# Altium integrated library OneBox.IntLib: 172 symbols (part 1 of 2)
Pins are listed as number, name and electrical type; pins without a type are passive.

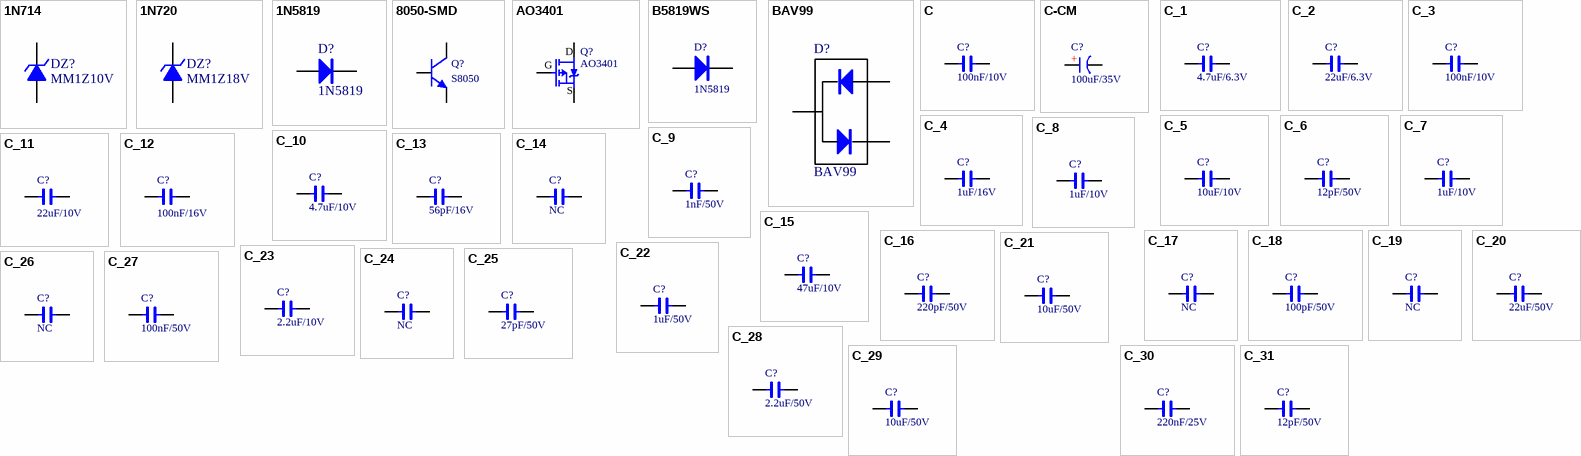
[diagram p0: symbols 1N714 to C_31]

## 1N714
designator DZ?, comment MM1Z10V
10V/0.25W稳压管; BOM名称: 10V/0.5W稳压管; 版权归属: 源创客; 学习资源: www.ooocke.com
footprint SOD-123 (2.7x1.6X1.1mm（长宽高，不包括引脚）)
pins: 1 A, 2 K

## 1N720
designator DZ?, comment MM1Z18V
18V/0.25W稳压管; BOM名称: 10V/0.5W稳压管; 版权归属: 源创客; 学习资源: www.ooocke.com
footprint SOD-123 (2.7x1.6X1.1mm（长宽高，不包括引脚）)
pins: 1 A, 2 K

## 1N5819
designator D?
肖特基二极管; 版权归属: 源创客; 属性: 40V/2A; BOM名称: 肖特基二极管; 学习资源: www.ooocke.com
footprint SOD-323 (1.8x1.3X0.9mm（长宽高，不包括引脚）)
footprint SMA (4.5x2.6*2.2mm（长宽高，不包括引脚）)
pins: 1 A, 2 K

## 8050-SMD
designator Q?, comment S8050
高频放大-NPN型; 版权归属: 源创客; 属性: 40V 1.5A 1W 100MHZ; BOM名称: 高频放大-NPN型; 学习资源: www.ooocke.com
footprint SOT23-3L (3x1.3x1mm(长宽高))
pins: 1 B, 2 E, 3 C

## AO3401
designator Q?
P沟道; BOM名称: 场效应管; 版权归属: 源创客; 描述: P沟道 30V/4.2A; 学习资源: www.ooocke.com
footprint SOT23-3L (3x1.3x1mm(长宽高))
pins: 1 G, 2 S, 3 D

## B5819WS
designator D?, comment 1N5819
肖特基二极管; 版权归属: 源创客; 属性: 40V/2A; BOM名称: 肖特基二极管; 学习资源: www.ooocke.com
footprint SOD-323 (1.8x1.3X0.9mm（长宽高，不包括引脚）)
pins: 1 A, 2 K

## BAV99
designator D?
双开关二极管; BOM名称: 肖特基二极管; 版权归属: 源创客; 属性: 40V/2A; 学习资源: www.ooocke.com
footprint SOT23-3L (3x1.3x1mm(长宽高))
pins: 1 K, 2 K, 3 K

## C
designator C?, comment 100nF/10V
X5R 10V C0402; BOM名称: 无极性贴片电容; ComponentLink1Description: Datasheet; ComponentLink1URL: www.baidu.com
footprint C0201_M (贴片MLCC电容)
footprint C0201_NS (贴片MLCC电容-无丝印)
footprint C0402_M (贴片MLCC电容)
footprint C0402_NS (贴片MLCC电容-无丝印)
footprint C0603_M (贴片MLCC电容-无丝印)
footprint C0603_NS (贴片MLCC电容-无丝印)
footprint C0805_M (贴片MLCC电容)
footprint C0805_NS (贴片MLCC电容-无丝印)
footprint C01005_NS (贴片MLCC电容-无丝印)
footprint C1206_M (贴片MLCC电容)
footprint C1210_NS (贴片MLCC电容 -无丝印)
footprint C1206_NS (贴片MLCC电容-无丝印)
footprint C1210_M (贴片MLCC电容)
footprint C1808_M (贴片MLCC电容)
footprint C1825_M (贴片MLCC电容)
footprint C2225_M (贴片MLCC电容)
pins: 1, 2

## C-CM
designator C?, comment 100uF/35V
CAP6.3x7.7; BOM名称: 贴片电解电容; 版权归属: 源创客; 学习资源: www.ooocke.com
footprint CM D(6.3*7.7) (贴片电解电容，直径6.3mm，高7.7mm)
pins: 1 A, 2 K
text: +

## C_1
designator C?, comment 4.7uF/6.3V
X5R 6.3V C0402; BOM名称: 无极性贴片电容; ComponentLink1Description: Datasheet; ComponentLink1URL: www.baidu.com
footprint C0201_M (贴片MLCC电容)
footprint C0201_NS (贴片MLCC电容-无丝印)
footprint C0402_M (贴片MLCC电容)
footprint C0402_NS (贴片MLCC电容-无丝印)
footprint C0603_M (贴片MLCC电容-无丝印)
footprint C0603_NS (贴片MLCC电容-无丝印)
footprint C0805_M (贴片MLCC电容)
footprint C0805_NS (贴片MLCC电容-无丝印)
footprint C01005_NS (贴片MLCC电容-无丝印)
footprint C1206_M (贴片MLCC电容)
footprint C1210_NS (贴片MLCC电容 -无丝印)
footprint C1206_NS (贴片MLCC电容-无丝印)
footprint C1210_M (贴片MLCC电容)
footprint C1808_M (贴片MLCC电容)
footprint C1825_M (贴片MLCC电容)
footprint C2225_M (贴片MLCC电容)
pins: 1, 2

## C_2
designator C?, comment 22uF/6.3V
X5R 6.3V C0603; BOM名称: 无极性贴片电容; ComponentLink1Description: Datasheet; ComponentLink1URL: www.baidu.com
footprint C0201_M (贴片MLCC电容)
footprint C0201_NS (贴片MLCC电容-无丝印)
footprint C0402_M (贴片MLCC电容)
footprint C0402_NS (贴片MLCC电容-无丝印)
footprint C0603_M (贴片MLCC电容-无丝印)
footprint C0603_NS (贴片MLCC电容-无丝印)
footprint C0805_M (贴片MLCC电容)
footprint C0805_NS (贴片MLCC电容-无丝印)
footprint C01005_NS (贴片MLCC电容-无丝印)
footprint C1206_M (贴片MLCC电容)
footprint C1210_NS (贴片MLCC电容 -无丝印)
footprint C1206_NS (贴片MLCC电容-无丝印)
footprint C1210_M (贴片MLCC电容)
footprint C1808_M (贴片MLCC电容)
footprint C1825_M (贴片MLCC电容)
footprint C2225_M (贴片MLCC电容)
pins: 1, 2

## C_3
designator C?, comment 100nF/10V
X5R 10V C0201; BOM名称: 无极性贴片电容; ComponentLink1Description: Datasheet; ComponentLink1URL: www.baidu.com
footprint C0201_M (贴片MLCC电容)
footprint C0201_NS (贴片MLCC电容-无丝印)
footprint C0402_M (贴片MLCC电容)
footprint C0402_NS (贴片MLCC电容-无丝印)
footprint C0603_M (贴片MLCC电容-无丝印)
footprint C0603_NS (贴片MLCC电容-无丝印)
footprint C0805_M (贴片MLCC电容)
footprint C0805_NS (贴片MLCC电容-无丝印)
footprint C01005_NS (贴片MLCC电容-无丝印)
footprint C1206_M (贴片MLCC电容)
footprint C1210_NS (贴片MLCC电容 -无丝印)
footprint C1206_NS (贴片MLCC电容-无丝印)
footprint C1210_M (贴片MLCC电容)
footprint C1808_M (贴片MLCC电容)
footprint C1825_M (贴片MLCC电容)
footprint C2225_M (贴片MLCC电容)
pins: 1, 2

## C_4
designator C?, comment 1uF/16V
X5R 16V C0402; BOM名称: 无极性贴片电容; ComponentLink1Description: Datasheet; ComponentLink1URL: www.baidu.com
footprint C0201_M (贴片MLCC电容)
footprint C0201_NS (贴片MLCC电容-无丝印)
footprint C0402_M (贴片MLCC电容)
footprint C0402_NS (贴片MLCC电容-无丝印)
footprint C0603_M (贴片MLCC电容-无丝印)
footprint C0603_NS (贴片MLCC电容-无丝印)
footprint C0805_M (贴片MLCC电容)
footprint C0805_NS (贴片MLCC电容-无丝印)
footprint C01005_NS (贴片MLCC电容-无丝印)
footprint C1206_M (贴片MLCC电容)
footprint C1210_NS (贴片MLCC电容 -无丝印)
footprint C1206_NS (贴片MLCC电容-无丝印)
footprint C1210_M (贴片MLCC电容)
footprint C1808_M (贴片MLCC电容)
footprint C1825_M (贴片MLCC电容)
footprint C2225_M (贴片MLCC电容)
pins: 1, 2

## C_5
designator C?, comment 10uF/10V
X5R 10V C0603; BOM名称: 无极性贴片电容; ComponentLink1Description: Datasheet; ComponentLink1URL: www.baidu.com
footprint C0201_M (贴片MLCC电容)
footprint C0201_NS (贴片MLCC电容-无丝印)
footprint C0402_M (贴片MLCC电容)
footprint C0402_NS (贴片MLCC电容-无丝印)
footprint C0603_M (贴片MLCC电容-无丝印)
footprint C0603_NS (贴片MLCC电容-无丝印)
footprint C0805_M (贴片MLCC电容)
footprint C0805_NS (贴片MLCC电容-无丝印)
footprint C01005_NS (贴片MLCC电容-无丝印)
footprint C1206_M (贴片MLCC电容)
footprint C1210_NS (贴片MLCC电容 -无丝印)
footprint C1206_NS (贴片MLCC电容-无丝印)
footprint C1210_M (贴片MLCC电容)
footprint C1808_M (贴片MLCC电容)
footprint C1825_M (贴片MLCC电容)
footprint C2225_M (贴片MLCC电容)
pins: 1, 2

## C_6
designator C?, comment 12pF/50V
C0G 50V C0201; BOM名称: 无极性贴片电容; ComponentLink1Description: Datasheet; ComponentLink1URL: www.baidu.com
footprint C0201_M (贴片MLCC电容)
footprint C0201_NS (贴片MLCC电容-无丝印)
footprint C0402_M (贴片MLCC电容)
footprint C0402_NS (贴片MLCC电容-无丝印)
footprint C0603_M (贴片MLCC电容-无丝印)
footprint C0603_NS (贴片MLCC电容-无丝印)
footprint C0805_M (贴片MLCC电容)
footprint C0805_NS (贴片MLCC电容-无丝印)
footprint C01005_NS (贴片MLCC电容-无丝印)
footprint C1206_M (贴片MLCC电容)
footprint C1210_NS (贴片MLCC电容 -无丝印)
footprint C1206_NS (贴片MLCC电容-无丝印)
footprint C1210_M (贴片MLCC电容)
footprint C1808_M (贴片MLCC电容)
footprint C1825_M (贴片MLCC电容)
footprint C2225_M (贴片MLCC电容)
pins: 1, 2

## C_7
designator C?, comment 1uF/10V
X5R 10V C0402; BOM名称: 无极性贴片电容; ComponentLink1Description: Datasheet; ComponentLink1URL: www.baidu.com
footprint C0201_M (贴片MLCC电容)
footprint C0201_NS (贴片MLCC电容-无丝印)
footprint C0402_M (贴片MLCC电容)
footprint C0402_NS (贴片MLCC电容-无丝印)
footprint C0603_M (贴片MLCC电容-无丝印)
footprint C0603_NS (贴片MLCC电容-无丝印)
footprint C0805_M (贴片MLCC电容)
footprint C0805_NS (贴片MLCC电容-无丝印)
footprint C01005_NS (贴片MLCC电容-无丝印)
footprint C1206_M (贴片MLCC电容)
footprint C1210_NS (贴片MLCC电容 -无丝印)
footprint C1206_NS (贴片MLCC电容-无丝印)
footprint C1210_M (贴片MLCC电容)
footprint C1808_M (贴片MLCC电容)
footprint C1825_M (贴片MLCC电容)
footprint C2225_M (贴片MLCC电容)
pins: 1, 2

## C_8
designator C?, comment 1uF/10V
X5R 10V C0201; BOM名称: 无极性贴片电容; ComponentLink1Description: Datasheet; ComponentLink1URL: www.baidu.com
footprint C0201_M (贴片MLCC电容)
footprint C0201_NS (贴片MLCC电容-无丝印)
footprint C0402_M (贴片MLCC电容)
footprint C0402_NS (贴片MLCC电容-无丝印)
footprint C0603_M (贴片MLCC电容-无丝印)
footprint C0603_NS (贴片MLCC电容-无丝印)
footprint C0805_M (贴片MLCC电容)
footprint C0805_NS (贴片MLCC电容-无丝印)
footprint C01005_NS (贴片MLCC电容-无丝印)
footprint C1206_M (贴片MLCC电容)
footprint C1210_NS (贴片MLCC电容 -无丝印)
footprint C1206_NS (贴片MLCC电容-无丝印)
footprint C1210_M (贴片MLCC电容)
footprint C1808_M (贴片MLCC电容)
footprint C1825_M (贴片MLCC电容)
footprint C2225_M (贴片MLCC电容)
pins: 1, 2

## C_9
designator C?, comment 1nF/50V
X5R 50V C0201; BOM名称: 无极性贴片电容; ComponentLink1Description: Datasheet; ComponentLink1URL: www.baidu.com
footprint C0201_M (贴片MLCC电容)
footprint C0201_NS (贴片MLCC电容-无丝印)
footprint C0402_M (贴片MLCC电容)
footprint C0402_NS (贴片MLCC电容-无丝印)
footprint C0603_M (贴片MLCC电容-无丝印)
footprint C0603_NS (贴片MLCC电容-无丝印)
footprint C0805_M (贴片MLCC电容)
footprint C0805_NS (贴片MLCC电容-无丝印)
footprint C01005_NS (贴片MLCC电容-无丝印)
footprint C1206_M (贴片MLCC电容)
footprint C1210_NS (贴片MLCC电容 -无丝印)
footprint C1206_NS (贴片MLCC电容-无丝印)
footprint C1210_M (贴片MLCC电容)
footprint C1808_M (贴片MLCC电容)
footprint C1825_M (贴片MLCC电容)
footprint C2225_M (贴片MLCC电容)
pins: 1, 2

## C_10
designator C?, comment 4.7uF/10V
X5R 10V C0603; BOM名称: 无极性贴片电容; ComponentLink1Description: Datasheet; ComponentLink1URL: www.baidu.com
footprint C0201_M (贴片MLCC电容)
footprint C0201_NS (贴片MLCC电容-无丝印)
footprint C0402_M (贴片MLCC电容)
footprint C0402_NS (贴片MLCC电容-无丝印)
footprint C0603_M (贴片MLCC电容-无丝印)
footprint C0603_NS (贴片MLCC电容-无丝印)
footprint C0805_M (贴片MLCC电容)
footprint C0805_NS (贴片MLCC电容-无丝印)
footprint C01005_NS (贴片MLCC电容-无丝印)
footprint C1206_M (贴片MLCC电容)
footprint C1210_NS (贴片MLCC电容 -无丝印)
footprint C1206_NS (贴片MLCC电容-无丝印)
footprint C1210_M (贴片MLCC电容)
footprint C1808_M (贴片MLCC电容)
footprint C1825_M (贴片MLCC电容)
footprint C2225_M (贴片MLCC电容)
pins: 1, 2

## C_11
designator C?, comment 22uF/10V
X5R 10V C0603; BOM名称: 无极性贴片电容; ComponentLink1Description: Datasheet; ComponentLink1URL: www.baidu.com
footprint C0201_M (贴片MLCC电容)
footprint C0201_NS (贴片MLCC电容-无丝印)
footprint C0402_M (贴片MLCC电容)
footprint C0402_NS (贴片MLCC电容-无丝印)
footprint C0603_M (贴片MLCC电容-无丝印)
footprint C0603_NS (贴片MLCC电容-无丝印)
footprint C0805_M (贴片MLCC电容)
footprint C0805_NS (贴片MLCC电容-无丝印)
footprint C01005_NS (贴片MLCC电容-无丝印)
footprint C1206_M (贴片MLCC电容)
footprint C1210_NS (贴片MLCC电容 -无丝印)
footprint C1206_NS (贴片MLCC电容-无丝印)
footprint C1210_M (贴片MLCC电容)
footprint C1808_M (贴片MLCC电容)
footprint C1825_M (贴片MLCC电容)
footprint C2225_M (贴片MLCC电容)
pins: 1, 2

## C_12
designator C?, comment 100nF/16V
X5R 16V C0201; BOM名称: 无极性贴片电容; ComponentLink1Description: Datasheet; ComponentLink1URL: www.baidu.com
footprint C0201_M (贴片MLCC电容)
footprint C0201_NS (贴片MLCC电容-无丝印)
footprint C0402_M (贴片MLCC电容)
footprint C0402_NS (贴片MLCC电容-无丝印)
footprint C0603_M (贴片MLCC电容-无丝印)
footprint C0603_NS (贴片MLCC电容-无丝印)
footprint C0805_M (贴片MLCC电容)
footprint C0805_NS (贴片MLCC电容-无丝印)
footprint C01005_NS (贴片MLCC电容-无丝印)
footprint C1206_M (贴片MLCC电容)
footprint C1210_NS (贴片MLCC电容 -无丝印)
footprint C1206_NS (贴片MLCC电容-无丝印)
footprint C1210_M (贴片MLCC电容)
footprint C1808_M (贴片MLCC电容)
footprint C1825_M (贴片MLCC电容)
footprint C2225_M (贴片MLCC电容)
pins: 1, 2

## C_13
designator C?, comment 56pF/16V
X5R 16V C0201; BOM名称: 无极性贴片电容; ComponentLink1Description: Datasheet; ComponentLink1URL: www.baidu.com
footprint C0201_M (贴片MLCC电容)
footprint C0201_NS (贴片MLCC电容-无丝印)
footprint C0402_M (贴片MLCC电容)
footprint C0402_NS (贴片MLCC电容-无丝印)
footprint C0603_M (贴片MLCC电容-无丝印)
footprint C0603_NS (贴片MLCC电容-无丝印)
footprint C0805_M (贴片MLCC电容)
footprint C0805_NS (贴片MLCC电容-无丝印)
footprint C01005_NS (贴片MLCC电容-无丝印)
footprint C1206_M (贴片MLCC电容)
footprint C1210_NS (贴片MLCC电容 -无丝印)
footprint C1206_NS (贴片MLCC电容-无丝印)
footprint C1210_M (贴片MLCC电容)
footprint C1808_M (贴片MLCC电容)
footprint C1825_M (贴片MLCC电容)
footprint C2225_M (贴片MLCC电容)
pins: 1, 2

## C_14
designator C?, comment NC
X5R 16V C0201; BOM名称: 无极性贴片电容; ComponentLink1Description: Datasheet; ComponentLink1URL: www.baidu.com
footprint C0201_M (贴片MLCC电容)
footprint C0201_NS (贴片MLCC电容-无丝印)
footprint C0402_M (贴片MLCC电容)
footprint C0402_NS (贴片MLCC电容-无丝印)
footprint C0603_M (贴片MLCC电容-无丝印)
footprint C0603_NS (贴片MLCC电容-无丝印)
footprint C0805_M (贴片MLCC电容)
footprint C0805_NS (贴片MLCC电容-无丝印)
footprint C01005_NS (贴片MLCC电容-无丝印)
footprint C1206_M (贴片MLCC电容)
footprint C1210_NS (贴片MLCC电容 -无丝印)
footprint C1206_NS (贴片MLCC电容-无丝印)
footprint C1210_M (贴片MLCC电容)
footprint C1808_M (贴片MLCC电容)
footprint C1825_M (贴片MLCC电容)
footprint C2225_M (贴片MLCC电容)
pins: 1, 2

## C_15
designator C?, comment 47uF/10V
X5R 10V C1206; BOM名称: 无极性贴片电容; ComponentLink1Description: Datasheet; ComponentLink1URL: www.baidu.com
footprint C0201_M (贴片MLCC电容)
footprint C0201_NS (贴片MLCC电容-无丝印)
footprint C0402_M (贴片MLCC电容)
footprint C0402_NS (贴片MLCC电容-无丝印)
footprint C0603_M (贴片MLCC电容-无丝印)
footprint C0603_NS (贴片MLCC电容-无丝印)
footprint C0805_M (贴片MLCC电容)
footprint C0805_NS (贴片MLCC电容-无丝印)
footprint C01005_NS (贴片MLCC电容-无丝印)
footprint C1206_M (贴片MLCC电容)
footprint C1210_NS (贴片MLCC电容 -无丝印)
footprint C1206_NS (贴片MLCC电容-无丝印)
footprint C1210_M (贴片MLCC电容)
footprint C1808_M (贴片MLCC电容)
footprint C1825_M (贴片MLCC电容)
footprint C2225_M (贴片MLCC电容)
pins: 1, 2

## C_16
designator C?, comment 220pF/50V
C0G 50V C0402; BOM名称: 无极性贴片电容; ComponentLink1Description: Datasheet; ComponentLink1URL: www.baidu.com
footprint C0201_M (贴片MLCC电容)
footprint C0201_NS (贴片MLCC电容-无丝印)
footprint C0402_M (贴片MLCC电容)
footprint C0402_NS (贴片MLCC电容-无丝印)
footprint C0603_M (贴片MLCC电容-无丝印)
footprint C0603_NS (贴片MLCC电容-无丝印)
footprint C0805_M (贴片MLCC电容)
footprint C0805_NS (贴片MLCC电容-无丝印)
footprint C01005_NS (贴片MLCC电容-无丝印)
footprint C1206_M (贴片MLCC电容)
footprint C1210_NS (贴片MLCC电容 -无丝印)
footprint C1206_NS (贴片MLCC电容-无丝印)
footprint C1210_M (贴片MLCC电容)
footprint C1808_M (贴片MLCC电容)
footprint C1825_M (贴片MLCC电容)
footprint C2225_M (贴片MLCC电容)
pins: 1, 2

## C_17
designator C?, comment NC
X5R 50V C0201 1nF; BOM名称: 无极性贴片电容; ComponentLink1Description: Datasheet; ComponentLink1URL: www.baidu.com
footprint C0201_M (贴片MLCC电容)
footprint C0201_NS (贴片MLCC电容-无丝印)
footprint C0402_M (贴片MLCC电容)
footprint C0402_NS (贴片MLCC电容-无丝印)
footprint C0603_M (贴片MLCC电容-无丝印)
footprint C0603_NS (贴片MLCC电容-无丝印)
footprint C0805_M (贴片MLCC电容)
footprint C0805_NS (贴片MLCC电容-无丝印)
footprint C01005_NS (贴片MLCC电容-无丝印)
footprint C1206_M (贴片MLCC电容)
footprint C1210_NS (贴片MLCC电容 -无丝印)
footprint C1206_NS (贴片MLCC电容-无丝印)
footprint C1210_M (贴片MLCC电容)
footprint C1808_M (贴片MLCC电容)
footprint C1825_M (贴片MLCC电容)
footprint C2225_M (贴片MLCC电容)
pins: 1, 2

## C_18
designator C?, comment 100pF/50V
C0G 50V C0201; BOM名称: 无极性贴片电容; ComponentLink1Description: Datasheet; ComponentLink1URL: www.baidu.com
footprint C0201_M (贴片MLCC电容)
footprint C0201_NS (贴片MLCC电容-无丝印)
footprint C0402_M (贴片MLCC电容)
footprint C0402_NS (贴片MLCC电容-无丝印)
footprint C0603_M (贴片MLCC电容-无丝印)
footprint C0603_NS (贴片MLCC电容-无丝印)
footprint C0805_M (贴片MLCC电容)
footprint C0805_NS (贴片MLCC电容-无丝印)
footprint C01005_NS (贴片MLCC电容-无丝印)
footprint C1206_M (贴片MLCC电容)
footprint C1210_NS (贴片MLCC电容 -无丝印)
footprint C1206_NS (贴片MLCC电容-无丝印)
footprint C1210_M (贴片MLCC电容)
footprint C1808_M (贴片MLCC电容)
footprint C1825_M (贴片MLCC电容)
footprint C2225_M (贴片MLCC电容)
pins: 1, 2

## C_19
designator C?, comment NC
X5R 10V C0402; BOM名称: 无极性贴片电容; ComponentLink1Description: Datasheet; ComponentLink1URL: www.baidu.com
footprint C0201_M (贴片MLCC电容)
footprint C0201_NS (贴片MLCC电容-无丝印)
footprint C0402_M (贴片MLCC电容)
footprint C0402_NS (贴片MLCC电容-无丝印)
footprint C0603_M (贴片MLCC电容-无丝印)
footprint C0603_NS (贴片MLCC电容-无丝印)
footprint C0805_M (贴片MLCC电容)
footprint C0805_NS (贴片MLCC电容-无丝印)
footprint C01005_NS (贴片MLCC电容-无丝印)
footprint C1206_M (贴片MLCC电容)
footprint C1210_NS (贴片MLCC电容 -无丝印)
footprint C1206_NS (贴片MLCC电容-无丝印)
footprint C1210_M (贴片MLCC电容)
footprint C1808_M (贴片MLCC电容)
footprint C1825_M (贴片MLCC电容)
footprint C2225_M (贴片MLCC电容)
pins: 1, 2

## C_20
designator C?, comment 22uF/50V
X5R 50V C0603; BOM名称: 无极性贴片电容; ComponentLink1Description: Datasheet; ComponentLink1URL: www.baidu.com
footprint C0201_M (贴片MLCC电容)
footprint C0201_NS (贴片MLCC电容-无丝印)
footprint C0402_M (贴片MLCC电容)
footprint C0402_NS (贴片MLCC电容-无丝印)
footprint C0603_M (贴片MLCC电容-无丝印)
footprint C0603_NS (贴片MLCC电容-无丝印)
footprint C0805_M (贴片MLCC电容)
footprint C0805_NS (贴片MLCC电容-无丝印)
footprint C01005_NS (贴片MLCC电容-无丝印)
footprint C1206_M (贴片MLCC电容)
footprint C1210_NS (贴片MLCC电容 -无丝印)
footprint C1206_NS (贴片MLCC电容-无丝印)
footprint C1210_M (贴片MLCC电容)
footprint C1808_M (贴片MLCC电容)
footprint C1825_M (贴片MLCC电容)
footprint C2225_M (贴片MLCC电容)
pins: 1, 2

## C_21
designator C?, comment 10uF/50V
X5R 50V C0603; BOM名称: 无极性贴片电容; ComponentLink1Description: Datasheet; ComponentLink1URL: www.baidu.com
footprint C0201_M (贴片MLCC电容)
footprint C0201_NS (贴片MLCC电容-无丝印)
footprint C0402_M (贴片MLCC电容)
footprint C0402_NS (贴片MLCC电容-无丝印)
footprint C0603_M (贴片MLCC电容-无丝印)
footprint C0603_NS (贴片MLCC电容-无丝印)
footprint C0805_M (贴片MLCC电容)
footprint C0805_NS (贴片MLCC电容-无丝印)
footprint C01005_NS (贴片MLCC电容-无丝印)
footprint C1206_M (贴片MLCC电容)
footprint C1210_NS (贴片MLCC电容 -无丝印)
footprint C1206_NS (贴片MLCC电容-无丝印)
footprint C1210_M (贴片MLCC电容)
footprint C1808_M (贴片MLCC电容)
footprint C1825_M (贴片MLCC电容)
footprint C2225_M (贴片MLCC电容)
pins: 1, 2

## C_22
designator C?, comment 1uF/50V
X5R 50V C0603; BOM名称: 无极性贴片电容; ComponentLink1Description: Datasheet; ComponentLink1URL: www.baidu.com
footprint C0201_M (贴片MLCC电容)
footprint C0201_NS (贴片MLCC电容-无丝印)
footprint C0402_M (贴片MLCC电容)
footprint C0402_NS (贴片MLCC电容-无丝印)
footprint C0603_M (贴片MLCC电容-无丝印)
footprint C0603_NS (贴片MLCC电容-无丝印)
footprint C0805_M (贴片MLCC电容)
footprint C0805_NS (贴片MLCC电容-无丝印)
footprint C01005_NS (贴片MLCC电容-无丝印)
footprint C1206_M (贴片MLCC电容)
footprint C1210_NS (贴片MLCC电容 -无丝印)
footprint C1206_NS (贴片MLCC电容-无丝印)
footprint C1210_M (贴片MLCC电容)
footprint C1808_M (贴片MLCC电容)
footprint C1825_M (贴片MLCC电容)
footprint C2225_M (贴片MLCC电容)
pins: 1, 2

## C_23
designator C?, comment 2.2uF/10V
X5R 10V C0201; BOM名称: 无极性贴片电容; ComponentLink1Description: Datasheet; ComponentLink1URL: www.baidu.com
footprint C0201_M (贴片MLCC电容)
footprint C0201_NS (贴片MLCC电容-无丝印)
footprint C0402_M (贴片MLCC电容)
footprint C0402_NS (贴片MLCC电容-无丝印)
footprint C0603_M (贴片MLCC电容-无丝印)
footprint C0603_NS (贴片MLCC电容-无丝印)
footprint C0805_M (贴片MLCC电容)
footprint C0805_NS (贴片MLCC电容-无丝印)
footprint C01005_NS (贴片MLCC电容-无丝印)
footprint C1206_M (贴片MLCC电容)
footprint C1210_NS (贴片MLCC电容 -无丝印)
footprint C1206_NS (贴片MLCC电容-无丝印)
footprint C1210_M (贴片MLCC电容)
footprint C1808_M (贴片MLCC电容)
footprint C1825_M (贴片MLCC电容)
footprint C2225_M (贴片MLCC电容)
pins: 1, 2

## C_24
designator C?, comment NC
C0G 50V C0201; BOM名称: 无极性贴片电容; ComponentLink1Description: Datasheet; ComponentLink1URL: www.baidu.com
footprint C0201_M (贴片MLCC电容)
footprint C0201_NS (贴片MLCC电容-无丝印)
footprint C0402_M (贴片MLCC电容)
footprint C0402_NS (贴片MLCC电容-无丝印)
footprint C0603_M (贴片MLCC电容-无丝印)
footprint C0603_NS (贴片MLCC电容-无丝印)
footprint C0805_M (贴片MLCC电容)
footprint C0805_NS (贴片MLCC电容-无丝印)
footprint C01005_NS (贴片MLCC电容-无丝印)
footprint C1206_M (贴片MLCC电容)
footprint C1210_NS (贴片MLCC电容 -无丝印)
footprint C1206_NS (贴片MLCC电容-无丝印)
footprint C1210_M (贴片MLCC电容)
footprint C1808_M (贴片MLCC电容)
footprint C1825_M (贴片MLCC电容)
footprint C2225_M (贴片MLCC电容)
pins: 1, 2

## C_25
designator C?, comment 27pF/50V
C0G 50V C0201; BOM名称: 无极性贴片电容; ComponentLink1Description: Datasheet; ComponentLink1URL: www.baidu.com
footprint C0201_M (贴片MLCC电容)
footprint C0201_NS (贴片MLCC电容-无丝印)
footprint C0402_M (贴片MLCC电容)
footprint C0402_NS (贴片MLCC电容-无丝印)
footprint C0603_M (贴片MLCC电容-无丝印)
footprint C0603_NS (贴片MLCC电容-无丝印)
footprint C0805_M (贴片MLCC电容)
footprint C0805_NS (贴片MLCC电容-无丝印)
footprint C01005_NS (贴片MLCC电容-无丝印)
footprint C1206_M (贴片MLCC电容)
footprint C1210_NS (贴片MLCC电容 -无丝印)
footprint C1206_NS (贴片MLCC电容-无丝印)
footprint C1210_M (贴片MLCC电容)
footprint C1808_M (贴片MLCC电容)
footprint C1825_M (贴片MLCC电容)
footprint C2225_M (贴片MLCC电容)
pins: 1, 2

## C_26
designator C?, comment NC
X5R 10V C0402 100nF; BOM名称: 无极性贴片电容; ComponentLink1Description: Datasheet; ComponentLink1URL: www.baidu.com
footprint C0201_M (贴片MLCC电容)
footprint C0201_NS (贴片MLCC电容-无丝印)
footprint C0402_M (贴片MLCC电容)
footprint C0402_NS (贴片MLCC电容-无丝印)
footprint C0603_M (贴片MLCC电容-无丝印)
footprint C0603_NS (贴片MLCC电容-无丝印)
footprint C0805_M (贴片MLCC电容)
footprint C0805_NS (贴片MLCC电容-无丝印)
footprint C01005_NS (贴片MLCC电容-无丝印)
footprint C1206_M (贴片MLCC电容)
footprint C1210_NS (贴片MLCC电容 -无丝印)
footprint C1206_NS (贴片MLCC电容-无丝印)
footprint C1210_M (贴片MLCC电容)
footprint C1808_M (贴片MLCC电容)
footprint C1825_M (贴片MLCC电容)
footprint C2225_M (贴片MLCC电容)
pins: 1, 2

## C_27
designator C?, comment 100nF/50V
X5R 50V C0603; BOM名称: 无极性贴片电容; ComponentLink1Description: Datasheet; ComponentLink1URL: www.baidu.com
footprint C0201_M (贴片MLCC电容)
footprint C0201_NS (贴片MLCC电容-无丝印)
footprint C0402_M (贴片MLCC电容)
footprint C0402_NS (贴片MLCC电容-无丝印)
footprint C0603_M (贴片MLCC电容-无丝印)
footprint C0603_NS (贴片MLCC电容-无丝印)
footprint C0805_M (贴片MLCC电容)
footprint C0805_NS (贴片MLCC电容-无丝印)
footprint C01005_NS (贴片MLCC电容-无丝印)
footprint C1206_M (贴片MLCC电容)
footprint C1210_NS (贴片MLCC电容 -无丝印)
footprint C1206_NS (贴片MLCC电容-无丝印)
footprint C1210_M (贴片MLCC电容)
footprint C1808_M (贴片MLCC电容)
footprint C1825_M (贴片MLCC电容)
footprint C2225_M (贴片MLCC电容)
pins: 1, 2

## C_28
designator C?, comment 2.2uF/50V
X5R 50V C0805; BOM名称: 无极性贴片电容; ComponentLink1Description: Datasheet; ComponentLink1URL: www.baidu.com
footprint C0201_M (贴片MLCC电容)
footprint C0201_NS (贴片MLCC电容-无丝印)
footprint C0402_M (贴片MLCC电容)
footprint C0402_NS (贴片MLCC电容-无丝印)
footprint C0603_M (贴片MLCC电容-无丝印)
footprint C0603_NS (贴片MLCC电容-无丝印)
footprint C0805_M (贴片MLCC电容)
footprint C0805_NS (贴片MLCC电容-无丝印)
footprint C01005_NS (贴片MLCC电容-无丝印)
footprint C1206_M (贴片MLCC电容)
footprint C1210_NS (贴片MLCC电容 -无丝印)
footprint C1206_NS (贴片MLCC电容-无丝印)
footprint C1210_M (贴片MLCC电容)
footprint C1808_M (贴片MLCC电容)
footprint C1825_M (贴片MLCC电容)
footprint C2225_M (贴片MLCC电容)
pins: 1, 2

## C_29
designator C?, comment 10uF/50V
X5R 50V C0805; BOM名称: 无极性贴片电容; ComponentLink1Description: Datasheet; ComponentLink1URL: www.baidu.com
footprint C0201_M (贴片MLCC电容)
footprint C0201_NS (贴片MLCC电容-无丝印)
footprint C0402_M (贴片MLCC电容)
footprint C0402_NS (贴片MLCC电容-无丝印)
footprint C0603_M (贴片MLCC电容-无丝印)
footprint C0603_NS (贴片MLCC电容-无丝印)
footprint C0805_M (贴片MLCC电容)
footprint C0805_NS (贴片MLCC电容-无丝印)
footprint C01005_NS (贴片MLCC电容-无丝印)
footprint C1206_M (贴片MLCC电容)
footprint C1210_NS (贴片MLCC电容 -无丝印)
footprint C1206_NS (贴片MLCC电容-无丝印)
footprint C1210_M (贴片MLCC电容)
footprint C1808_M (贴片MLCC电容)
footprint C1825_M (贴片MLCC电容)
footprint C2225_M (贴片MLCC电容)
pins: 1, 2

## C_30
designator C?, comment 220nF/25V
X5R 25V C0402; BOM名称: 无极性贴片电容; ComponentLink1Description: Datasheet; ComponentLink1URL: www.baidu.com
footprint C0201_M (贴片MLCC电容)
footprint C0201_NS (贴片MLCC电容-无丝印)
footprint C0402_M (贴片MLCC电容)
footprint C0402_NS (贴片MLCC电容-无丝印)
footprint C0603_M (贴片MLCC电容-无丝印)
footprint C0603_NS (贴片MLCC电容-无丝印)
footprint C0805_M (贴片MLCC电容)
footprint C0805_NS (贴片MLCC电容-无丝印)
footprint C01005_NS (贴片MLCC电容-无丝印)
footprint C1206_M (贴片MLCC电容)
footprint C1210_NS (贴片MLCC电容 -无丝印)
footprint C1206_NS (贴片MLCC电容-无丝印)
footprint C1210_M (贴片MLCC电容)
footprint C1808_M (贴片MLCC电容)
footprint C1825_M (贴片MLCC电容)
footprint C2225_M (贴片MLCC电容)
pins: 1, 2

## C_31
designator C?, comment 12pF/50V
C0G 50V C0402; BOM名称: 无极性贴片电容; ComponentLink1Description: Datasheet; ComponentLink1URL: www.baidu.com
footprint C0201_M (贴片MLCC电容)
footprint C0201_NS (贴片MLCC电容-无丝印)
footprint C0402_M (贴片MLCC电容)
footprint C0402_NS (贴片MLCC电容-无丝印)
footprint C0603_M (贴片MLCC电容-无丝印)
footprint C0603_NS (贴片MLCC电容-无丝印)
footprint C0805_M (贴片MLCC电容)
footprint C0805_NS (贴片MLCC电容-无丝印)
footprint C01005_NS (贴片MLCC电容-无丝印)
footprint C1206_M (贴片MLCC电容)
footprint C1210_NS (贴片MLCC电容 -无丝印)
footprint C1206_NS (贴片MLCC电容-无丝印)
footprint C1210_M (贴片MLCC电容)
footprint C1808_M (贴片MLCC电容)
footprint C1825_M (贴片MLCC电容)
footprint C2225_M (贴片MLCC电容)
pins: 1, 2

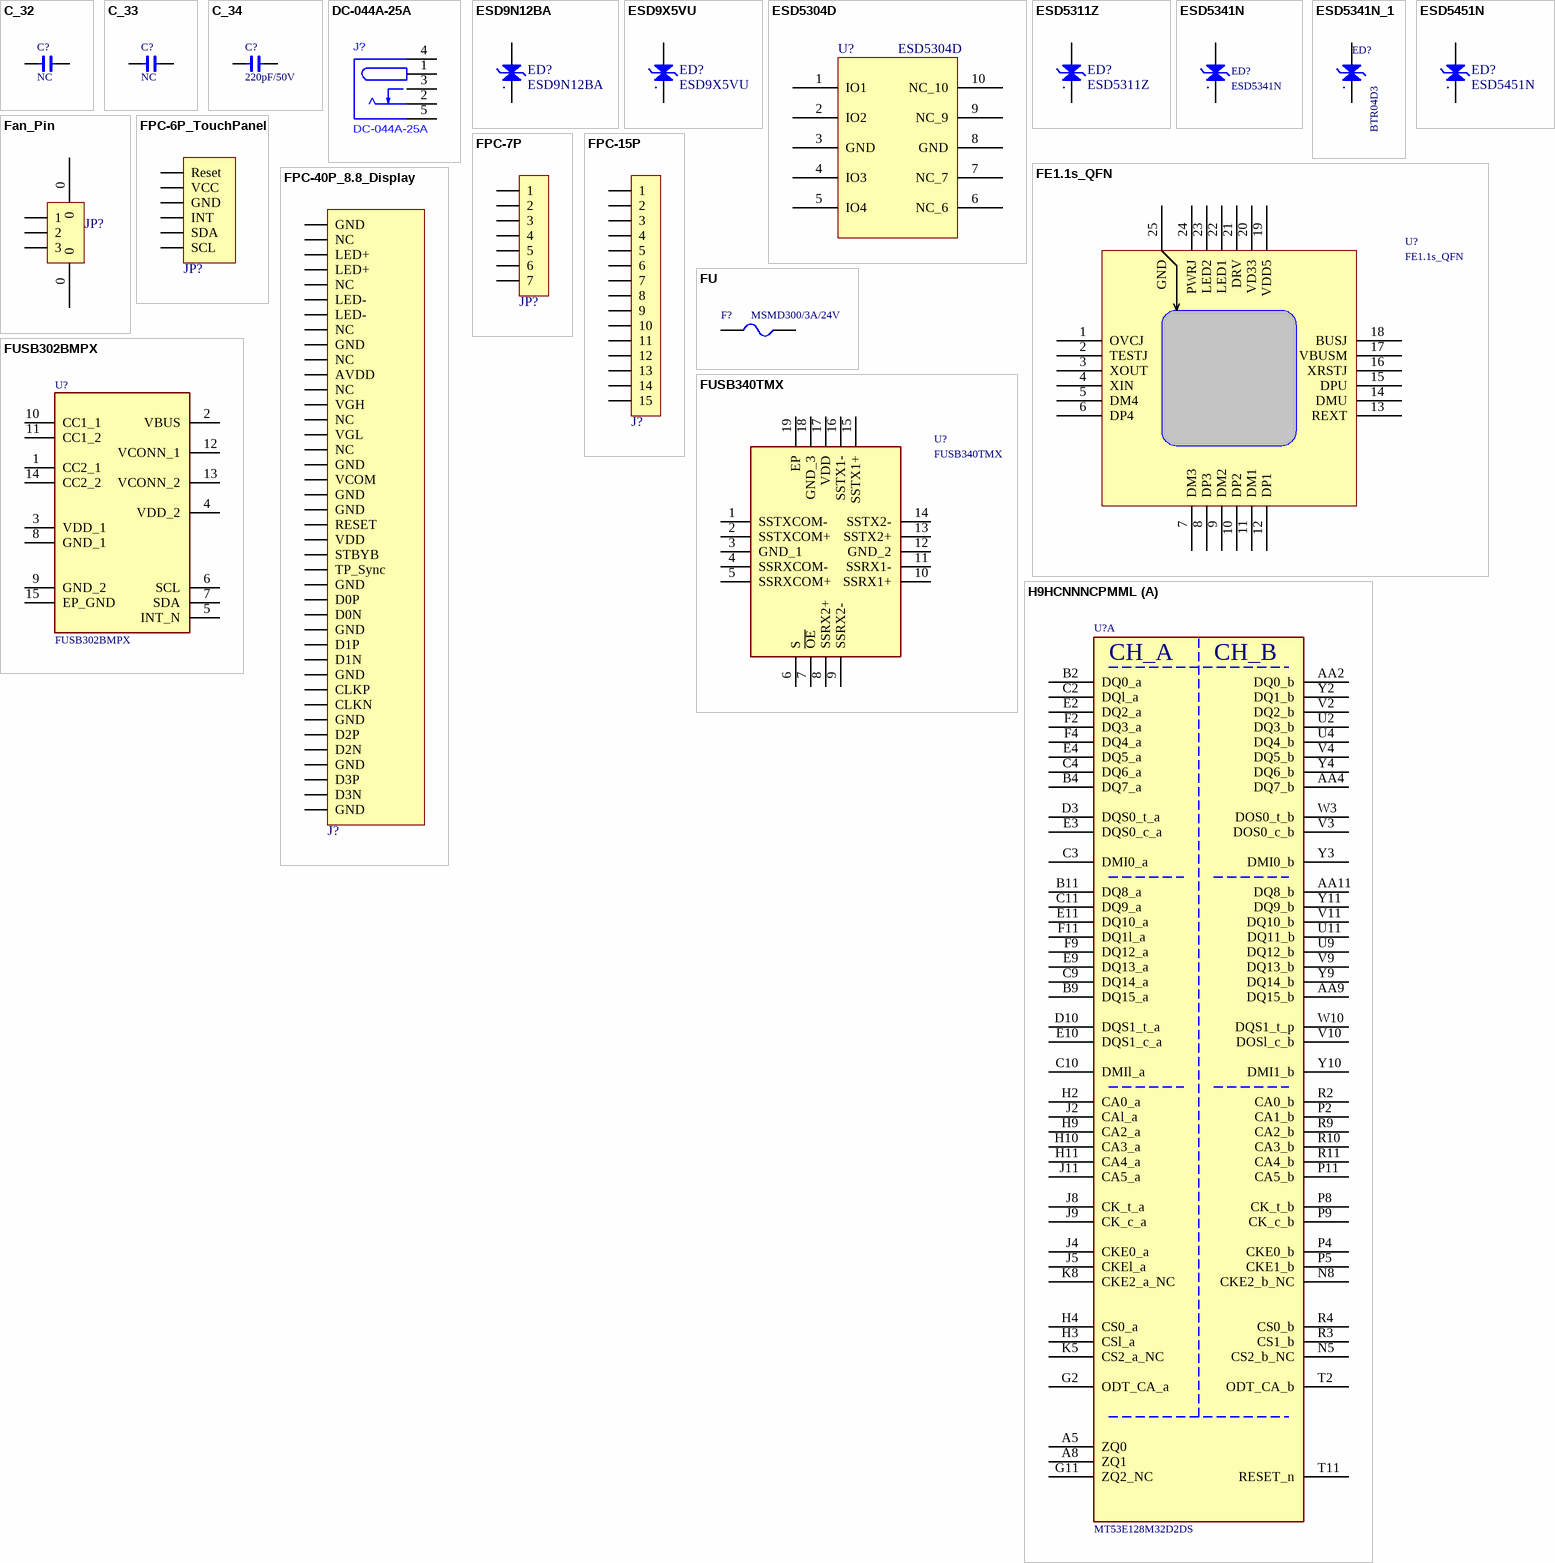
[diagram p1: symbols C_32 to H9HCNNNCPMML]

## C_32
designator C?, comment NC
C0G 50V C0402; BOM名称: 无极性贴片电容; ComponentLink1Description: Datasheet; ComponentLink1URL: www.baidu.com
footprint C0201_M (贴片MLCC电容)
footprint C0201_NS (贴片MLCC电容-无丝印)
footprint C0402_M (贴片MLCC电容)
footprint C0402_NS (贴片MLCC电容-无丝印)
footprint C0603_M (贴片MLCC电容-无丝印)
footprint C0603_NS (贴片MLCC电容-无丝印)
footprint C0805_M (贴片MLCC电容)
footprint C0805_NS (贴片MLCC电容-无丝印)
footprint C01005_NS (贴片MLCC电容-无丝印)
footprint C1206_M (贴片MLCC电容)
footprint C1210_NS (贴片MLCC电容 -无丝印)
footprint C1206_NS (贴片MLCC电容-无丝印)
footprint C1210_M (贴片MLCC电容)
footprint C1808_M (贴片MLCC电容)
footprint C1825_M (贴片MLCC电容)
footprint C2225_M (贴片MLCC电容)
pins: 1, 2

## C_33
designator C?, comment NC
C0G 50V C0402 100pF; BOM名称: 无极性贴片电容; ComponentLink1Description: Datasheet; ComponentLink1URL: www.baidu.com
footprint C0201_M (贴片MLCC电容)
footprint C0201_NS (贴片MLCC电容-无丝印)
footprint C0402_M (贴片MLCC电容)
footprint C0402_NS (贴片MLCC电容-无丝印)
footprint C0603_M (贴片MLCC电容-无丝印)
footprint C0603_NS (贴片MLCC电容-无丝印)
footprint C0805_M (贴片MLCC电容)
footprint C0805_NS (贴片MLCC电容-无丝印)
footprint C01005_NS (贴片MLCC电容-无丝印)
footprint C1206_M (贴片MLCC电容)
footprint C1210_NS (贴片MLCC电容 -无丝印)
footprint C1206_NS (贴片MLCC电容-无丝印)
footprint C1210_M (贴片MLCC电容)
footprint C1808_M (贴片MLCC电容)
footprint C1825_M (贴片MLCC电容)
footprint C2225_M (贴片MLCC电容)
pins: 1, 2

## C_34
designator C?, comment 220pF/50V
C0G 50V C0201; BOM名称: 无极性贴片电容; ComponentLink1Description: Datasheet; ComponentLink1URL: www.baidu.com
footprint C0201_M (贴片MLCC电容)
footprint C0201_NS (贴片MLCC电容-无丝印)
footprint C0402_M (贴片MLCC电容)
footprint C0402_NS (贴片MLCC电容-无丝印)
footprint C0603_M (贴片MLCC电容-无丝印)
footprint C0603_NS (贴片MLCC电容-无丝印)
footprint C0805_M (贴片MLCC电容)
footprint C0805_NS (贴片MLCC电容-无丝印)
footprint C01005_NS (贴片MLCC电容-无丝印)
footprint C1206_M (贴片MLCC电容)
footprint C1210_NS (贴片MLCC电容 -无丝印)
footprint C1206_NS (贴片MLCC电容-无丝印)
footprint C1210_M (贴片MLCC电容)
footprint C1808_M (贴片MLCC电容)
footprint C1825_M (贴片MLCC电容)
footprint C2225_M (贴片MLCC电容)
pins: 1, 2

## DC-044A-25A
designator J?
footprint DC-IN-TH_DC-044A-25A
pins: 1, 2, 3, 4, 5

## ESD9N12BA
designator ED?
footprint DFN1006_2L
pins: 1 A, 2 K

## ESD9X5VU
designator ED?
footprint DFN1006_2L
pins: 1 A, 2 K

## ESD5304D
designator U?
footprint DFN2510-10L
footprint DFN2510
pins: 1 IO1, 2 IO2, 3 GND, 4 IO3, 5 IO4, 6 NC_6, 7 NC_7, 8 GND, 9 NC_9, 10 NC_10

## ESD5311Z
designator ED?
footprint DFN0603_2L
pins: 1 A, 2 K

## ESD5341N
designator ED?
footprint DFN1006_2L
pins: 1 A, 2 K

## ESD5341N_1
designator ED?, comment BTR04D3
footprint DFN1006_2L
pins: 1 A, 2 K

## ESD5451N
designator ED?
footprint DFN1006_2L
pins: 1 A, 2 K

## Fan_Pin
designator JP?, comment HDR-1X3  (value not drawn)
3P接插件; 版权归属: 源创客; BOM名称: 3P接插件; 学习资源: www.ooocke.com
footprint MX 1.25-LS-3P (长：8.5m，宽：3.7mm，高：4.7mm)
pins: 0, 0, 1, 2, 3

## FE1.1s_QFN
designator U?
footprint QFN24 4x4_L (24脚，长x宽x高：4x4x1mm，脚距：0.5mm)
pins: 1 OVCJ, 2 TESTJ, 3 XOUT, 4 XIN, 5 DM4, 6 DP4, 7 DM3, 8 DP3, 9 DM2, 10 DP2, 11 DM1, 12 DP1, 13 REXT, 14 DMU, 15 DPU, 16 XRSTJ, 17 VBUSM, 18 BUSJ, 19 VDD5, 20 VD33, 21 DRV, 22 LED1, 23 LED2, 24 PWRJ, 25 GND

## FPC-6P_TouchPanel
designator JP?, comment FPC1.0-6P  (value not drawn)
FPC连接器; 版权归属: 源创客; BOM名称: FPC连接器; 学习资源: www.ooocke.com
footprint FPC0.5 2H-WS-6P (长：7.2mm，宽：5.2mm，高：2mm)
pins: 1 Reset, 2 VCC, 3 GND, 4 INT, 5 SDA, 6 SCL

## FPC-7P
designator JP?, comment FPC1.0-7P  (value not drawn)
FPC连接器; 版权归属: 源创客; BOM名称: FPC连接器; 学习资源: www.ooocke.com
footprint FPC0.5 2H-WS-7P (长：7.7mm，宽：5.2mm，高：2mm)
footprint FPC0.5 K-A-7PB (长：7.7mm，宽：5.2mm，高：2mm)
pins: 1, 2, 3, 4, 5, 6, 7

## FPC-15P
designator J?, comment FPC1.0-15P  (value not drawn)
FPC连接器; 版权归属: 源创客; BOM名称: FPC连接器; 学习资源: www.ooocke.com
footprint FPC1.0-2H-WS-15P (翻盖FPC，脚距1mm，不含脚（长19.9mm，宽5.2mm，高1.96mm）)
footprint FPC1.0-2H-LI-15P (翻盖FPC，脚距1mm，不含脚（长19.9mm，宽5.2mm，高1.96mm）)
pins: 1, 2, 3, 4, 5, 6, 7, 8, 9, 10, 11, 12, 13, 14, 15

## FPC-40P_8.8_Display
designator J?, comment FPC1.0-40P  (value not drawn)
FPC连接器; 版权归属: 源创客; BOM名称: FPC连接器; 学习资源: www.ooocke.com
footprint FPC0.5 2H-WS-40P (长：24.2mm，宽：5.2mm，高：2mm)
pins: 1 GND, 2 NC, 3 LED+, 4 LED+, 5 NC, 6 LED-, 7 LED-, 8 NC, 9 GND, 10 NC, 11 AVDD, 12 NC, 13 VGH, 14 NC, 15 VGL, 16 NC, 17 GND, 18 VCOM, 19 GND, 20 GND, 21 RESET, 22 VDD, 23 STBYB, 24 TP_Sync, 25 GND, 26 D0P, 27 D0N, 28 GND, 29 D1P, 30 D1N, 31 GND, 32 CLKP, 33 CLKN, 34 GND, 35 D2P, 36 D2N, 37 GND, 38 D3P, 39 D3N, 40 GND

## FU
designator F?, comment MSMD300/3A/24V
贴片保险丝; 版权归属: 源创客; BOM名称: 贴片保险丝; 学习资源: www.ooocke.com
footprint FU 1812 (贴片保险丝)
pins: 1, 2

## FUSB302BMPX
designator U?
Integrated Circuit; Manufacturer_Name: onsemi; Datasheet Link: https://www.onsemi.com/pub/Collateral/FUSB302B-D.PDF; Height: 0.8mm; Manufacturer_Part_Number: FUSB302BMPX
footprint WQFN-14
pins: 1 CC2_1, 2 VBUS, 3 VDD_1, 4 VDD_2, 5 INT_N, 6 SCL, 7 SDA, 8 GND_1, 9 GND_2, 10 CC1_1, 11 CC1_2, 12 VCONN_1, 13 VCONN_2, 14 CC2_2, 15 EP_GND